# Altium footprint library CD's_LIB_2018.PcbLib: 155 footprints (part 7 of 10)
Each footprint in its own frame and in the unit in brackets; x right, y up, seen from the top. Pads: shape width x height; smd on the part's side, far side on the other; paste and mask are expansions set on the pad; w line width, h text height; cw(c..) or ccw(c..) is an arc to the next point about the centre after c.
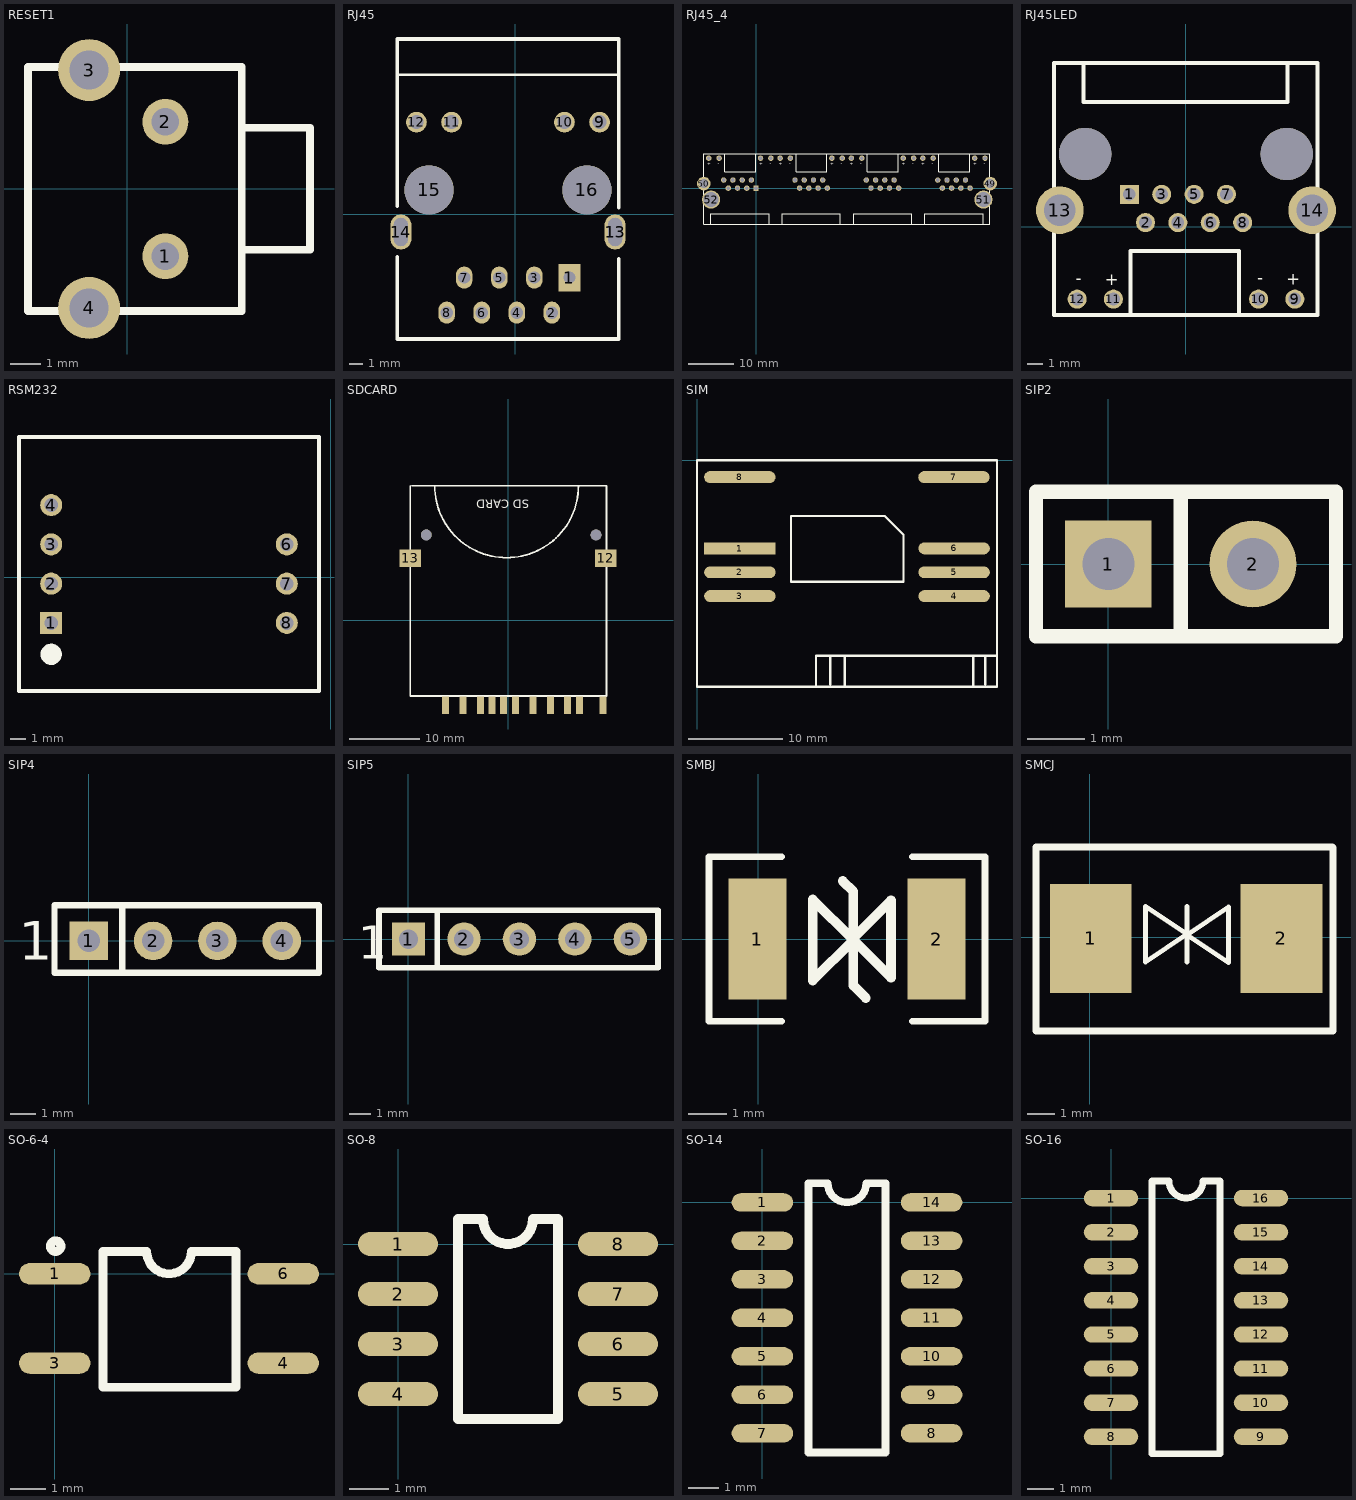
[diagram p6: the footprints below, top view; thin cyan lines are the x and y axes]

## RESET1 [mm]
pads (4):
  round 1.5 hole 0.9: 1(1.243,-2.211) 2(1.243,2.189)
  round 2.032 hole 1.27: 3(-1.257,3.888) 4(-1.257,-3.909)
Top Overlay:
  lines w0.254: -2.257,-4.011 -3.257,-4.011 -3.257,3.989 -2.257,3.989 ; -0.257,-4.011 3.743,-4.011 3.743,3.989 -0.257,3.989 ; 3.743,-2.004 5.977,-2.004 5.977,1.996 3.743,1.996
3D body: height 7, standoff -4, extent -2.945,-3.725 4.355,3.675

## RJ45 [mm]
pads (16):
  rect 1.6x2 hole 0.89: 1(3.942,-4.572)
  oval 1.2x1.6 hole 0.89: 2(2.672,-7.112) 3(1.402,-4.572) 4(0.132,-7.112) 5(-1.138,-4.572) 6(-2.408,-7.112) 7(-3.678,-4.572) 8(-4.948,-7.112)
  round 1.5 hole 1.02: 9(6.117,6.678) 10(3.577,6.678) 11(-4.593,6.678) 12(-7.133,6.678)
  oval 1.524x2.54 hole 1.016 slot 2.032 at 90 deg: 13(7.242,-1.272) 14(-8.258,-1.272)
  round 3.556 hole 3.556: 15(-6.223,1.778) 16(5.207,1.778)
Top Overlay:
  lines w0.2: -8.508,10.103 7.492,10.103
  lines w0.254: -8.508,-3.069 -8.508,-9.017 7.492,-9.017 7.492,-3.2 ; -8.508,0.575 -8.508,12.698 7.492,12.698 7.492,0.481

## RJ45_4 [mm]
pads (52):
  rect 1.2x1.2 hole 0.8: 1(0,0)
  round 1.2 hole 0.8: 2(-1.02,1.78) 3(-2.04,0) 4(-3.06,1.78) 5(-4.08,0) 6(-5.1,1.78) 7(-6.12,0) 8(-7.141,1.78) 9(-10.431,6.6) 10(-8.141,6.6) 11(1,6.6) 12(3.29,6.6) 13(15.74,0) 14(14.72,1.78) 15(13.7,0) 16(12.68,1.78) 17(11.66,0) 18(10.64,1.78) 19(9.62,0) 20(8.599,1.78) 21(5.309,6.6) 22(7.599,6.6) 23(16.74,6.6) 24(19.03,6.6) 25(31.49,0) 26(30.47,1.78) 27(29.45,0) 28(28.43,1.78) 29(27.41,0) 30(26.39,1.78) 31(25.37,0) 32(24.349,1.78) 33(21.059,6.6) 34(23.349,6.6) 35(32.49,6.6) 36(34.78,6.6) 37(47.24,0) 38(46.225,1.78) 39(45.205,0) 40(44.185,1.78) 41(43.165,0) 42(42.145,1.78) 43(41.125,0) 44(40.104,1.78) 45(36.814,6.6) 46(39.104,6.6) 47(48.245,6.6) 48(50.535,6.6)
  round 3 hole 2: 49(51.679,1) 50(-11.521,1)
  round 4 hole 3.3: 51(50.18,-2.54) 52(-9.92,-2.54)
Top Overlay:
  lines w0.254: -9.969,-8.002 -9.969,-5.617 2.884,-5.617 2.884,-8.005 ; -6.895,7.613 -6.895,3.577 -0.088,3.577 -0.088,7.613 ; 4.219,-8.002 20.12,-8.002 ; 4.219,7.613 20.119,7.613 ; 4.379,7.613 -11.521,7.613 -11.521,1 -11.521,-8.002 4.38,-8.002 ; 5.771,-8.002 5.771,-5.617 18.624,-5.617 18.624,-8.005 ; 8.845,7.613 8.845,3.577 15.652,3.577 15.652,7.613 ; 19.969,-8.002 35.87,-8.002 ; 19.969,7.613 35.869,7.613 ; 21.521,-8.002 21.521,-5.617 34.374,-5.617 34.374,-8.005 ; 24.595,7.613 24.595,3.577 31.402,3.577 31.402,7.613 ; 35.724,-8.002 51.625,-8.002 51.625,1 ; 35.724,7.613 51.624,7.613 51.624,0.999 ; 37.277,-8.002 37.277,-5.617 50.129,-5.617 50.129,-8.005 ; 40.35,7.613 40.35,3.577 47.157,3.577 47.157,7.613
  text "+" at 20.734,5.025 h0.76
  text "-" at 23.045,5.025 h0.76
  text "+" at 32.164,5.076 h0.76
  text "-" at 34.475,5.076 h0.76
  text "+" at 36.489,5.025 h0.76
  text "-" at 38.801,5.025 h0.76
  text "+" at 47.919,5.076 h0.76
  text "-" at 50.231,5.076 h0.76
  text "+" at -10.756,5.025 h0.76
  text "-" at -8.445,5.025 h0.76
  text "+" at 0.674,5.076 h0.76
  text "-" at 2.985,5.076 h0.76
  text "+" at 4.984,5.025 h0.76
  text "-" at 7.295,5.025 h0.76
  text "+" at 16.414,5.076 h0.76
  text "-" at 18.725,5.076 h0.76

## RJ45LED [mm]
pads (16):
  rect 1.2x1.2 hole 0.8: 1(-3.571,2.03)
  round 1.2 hole 0.8: 2(-2.551,0.25) 3(-1.531,2.03) 4(-0.511,0.25) 5(0.509,2.03) 6(1.529,0.25) 7(2.549,2.03) 8(3.571,0.25) 9(6.861,-4.57) 10(4.571,-4.57) 11(-4.571,-4.57) 12(-6.861,-4.57)
  round 3 hole 2: 13(-7.951,1.03) 14(7.951,1.03)
  round 3.3 hole 3.3: ""(-6.351,4.57) ""(6.349,4.57)
Top Overlay:
  lines w0.254: -6.454,10.238 -6.454,7.851 6.398,7.851 6.398,10.235 ; -3.483,-5.583 -3.483,-1.547 3.325,-1.547 3.325,-5.583 ; -8.331,-5.583 -8.331,10.312 8.28,10.312 8.28,-5.583 -8.331,-5.583
  text "-" at -6.556,-3.046 h0.76
  text "+" at -4.245,-3.046 h0.76
  text "-" at 4.874,-2.995 h0.76
  text "+" at 7.185,-2.995 h0.76
3D body: height 2.88, standoff -13.9, extent -8.306,-5.865 8.294,10.335

## RSM232 [mil]
pads (7):
  rect 56x56 hole 35: 1(-712,-116.83)
  round 56 hole 35: 2(-712,-16.83) 3(-712,83.17) 4(-712,183.17) 6(-112,83.17) 7(-112,-16.83) 8(-112,-116.83)
Top Overlay:
  circle w30: c-712,-196.83 r12
  lines w10: -794,-289.83 -30,-289.83 -30,356.17 -794,356.17 -794,-289.83

## SDCARD [mm]
pads (15):
  rect 1x2.5 smd: 1(-6.43,-12.15) 2(-3.93,-12.15) 3(-0.63,-12.15) 4(1.07,-12.15) 5(3.57,-12.15) 6(6.07,-12.15) 7(8.5,-12.15) 8(10.2,-12.15) 9(-8.93,-12.15) 10(13.55,-12.15) 11(-2.28,-12.15)
  rect 3.048x2.5 smd: 12(13.95,8.85) 13(-13.95,8.85)
  round 1.524 hole 1.524: ""(-11.65,12.15) ""(12.55,12.15)
Top Overlay:
  lines w0.254: -13.95,19.15 -13.95,-10.85 14.05,-10.85 14.05,19.15 -13.7,19.15 ; -10.45,19.15 ccw(c-0.2,19.15) 10.05,19.15
  text "SD CARD" at 3.05,17.15 h1.2

## SIM [mil]
pads (8):
  rect 300x50 smd: 1(179.68,-370.32)
  oval 300x50 smd: 2(180,-470) 3(180,-570) 4(1080,-570) 5(1080,-470) 6(1080,-370) 7(1079.18,-70.48) 8(179.68,-70.48)
Top Overlay:
  lines w10: 500,-950 500,-820 1260,-820 ; 560,-940 560,-820 ; 620,-950 620,-820 ; 1160,-950 1160,-820 ; 1210,-940 1210,-820 ; 1260,-170 1260,0 1100,0 0,0 0,-950 1260,-950 1260,-160 ; 394.96,-509.37 867.4,-509.37 867.4,-312.52 788.66,-233.78 394.96,-233.78 394.96,-509.37

## SIP2 [mil]
pads (2):
  rect 60x60 hole 36: 1(0,0)
  round 60 hole 36: 2(100,0)
Top Overlay:
  lines w10: 50,-50 50,50 ; -50,-50 -50,50 157.48,50 157.48,-50 -50,-50
3D body: height 336.22, standoff -118.11, extent -46.99,-49.99 153.01,50.01

## SIP4 [mil]
pads (4):
  rect 60x60 hole 35: 1(0,0)
  round 60 hole 35: 2(100,0) 3(200,0) 4(300,0)
Top Overlay:
  lines w10: 52,-47 52,53 ; 357.57,55.12 -53.15,55.12 -53.15,-49.21 357.79,-49.21 357.79,54.91
  text "1" at -108.27,-29.53 h60
3D body: height 336.22, standoff -118.11, extent -49.99,-49.99 350.01,50.01

## SIP5 [mil]
pads (5):
  rect 60x60 hole 35: 1(0,0)
  round 60 hole 35: 2(100,0) 3(200,0) 4(300,0) 5(400,0)
Top Overlay:
  lines w10: 52,-52 52,52.33 ; -53.15,-52 449.79,-52 450,-51.79 450,52.21 449.88,52.33 -53.15,52.33 -53.15,-52
  text "1" at -91,-35 h60
3D body: height 336.22, standoff -118.11, extent -49.99,-49.99 450.01,50.01

## SMBJ [mil]
pads (2):
  rect 60x125 smd: 1(-0.92,0.47) 2(184.08,0.47)
Top Overlay:
  lines w7: 24.08,-84.53 -50.92,-84.53 -50.92,85.47 24.08,85.47 ; 159.08,-84.53 234.08,-84.53 234.08,85.47 159.08,85.47
  lines w10: 87.08,60.47 98.08,49.47 98.08,-47.53 111.08,-60.53 ; 98.08,-1.53 98.08,-0.53 ; 98.08,1.47 137.08,40.47 137.08,-39.53 98.08,-0.53 ; 98.08,-0.53 56.08,-42.53 56.08,41.47 98.08,-0.53

## SMCJ [mm]
pads (2):
  rect 3x4 smd: 1(0.037,-0.033) 2(7.037,-0.033)
Top Overlay:
  lines w0.178: 3.568,-0.897 3.568,1.135 ; 2.044,-0.897 3.568,0.119 2.044,1.135 2.044,-0.897 ; 3.568,0.094 5.092,-0.922 5.092,1.11 3.568,0.094
  lines w0.254: 8.902,3.32 -1.969,3.32 -1.969,-3.437 8.927,-3.437 8.927,3.294

## SO-6-4 [mil]
pads (4):
  oval 80x24 smd: 1(0,0) 3(0,-100) 4(255.91,-100) 6(255.91,0)
Top Overlay:
  circle w10: c1,31 r5.91
  lines w10: 54,-127 203,-127 203,25 153,25 cw(c128,25) 103,25 54,25 54,-127

## SO-8 [mil]
pads (8):
  oval 80x24 smd: 1(0,0) 2(0,-50) 3(0,-100) 4(0,-150) 5(220,-150) 6(220,-100) 7(220,-50) 8(220,0)
Top Overlay:
  lines w10: 60,-175 60,25 85,25 ccw(c110,25) 135,25 160,25 160,-175 60,-175
3D body: height 66.93, standoff 0, extent -8.1,-171.46 228.12,21.46

## SO-14 [mil]
pads (14):
  oval 80x24 smd: 1(0,0) 2(0,-50) 3(0,-100) 4(0,-150) 5(0,-200) 6(0,-250) 7(0,-300) 8(220,-300) 9(220,-250) 10(220,-200) 11(220,-150) 12(220,-100) 13(220,-50) 14(220,0)
Top Overlay:
  lines w10: 60,-325 160,-325 160,25 135,25 cw(c110,25) 85,25 60,25 60,-325
3D body: height 69.88, standoff 0.46, extent -10.8,-321.26 230.81,21.26

## SO-16 [mil]
pads (16):
  oval 80x24 smd: 1(0,0) 2(0,-50) 3(0,-100) 4(0,-150) 5(0,-200) 6(0,-250) 7(0,-300) 8(0,-350) 9(220,-350) 10(220,-300) 11(220,-250) 12(220,-200) 13(220,-150) 14(220,-100) 15(220,-50) 16(220,0)
Top Overlay:
  lines w10: 60,-375 160,-375 160,25 135,25 cw(c110,25) 85,25 60,25 60,-375
3D body: height 69.88, standoff 0.46, extent -10.8,-371.26 230.81,21.26